# Altium schematic symbol library jlcpcb_2025_04_inductors_extended_0402.schlib: 1396 symbols (part 6 of 8)
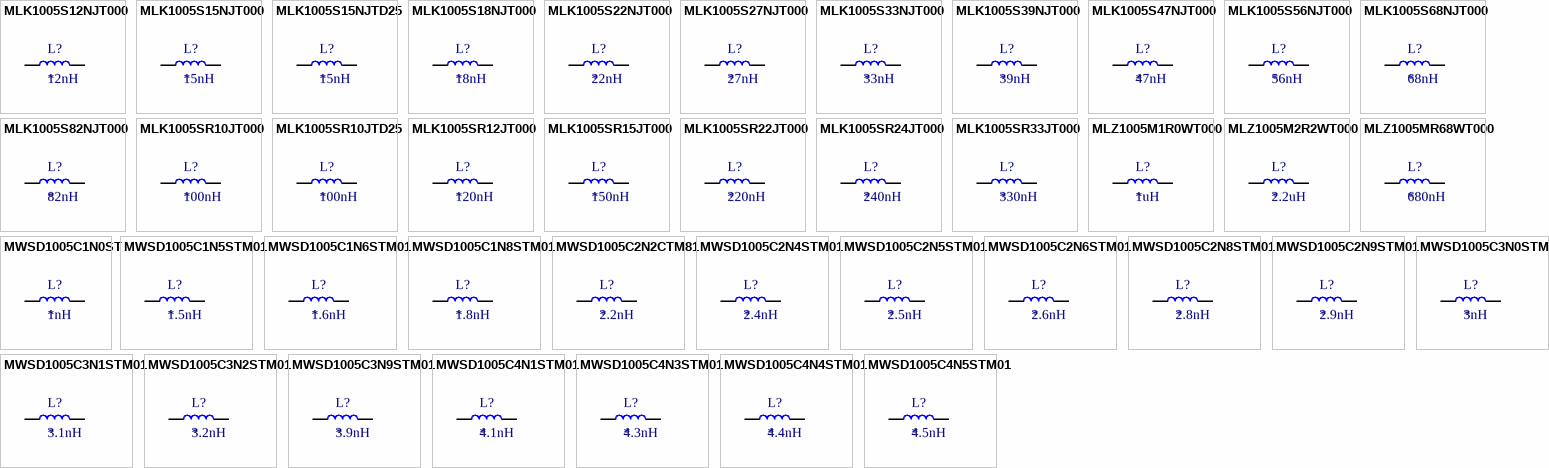
[diagram p39: symbols MLK1005S12NJT000 to MWSD1005C4N5STM01]

## MWSD1005C2N2CTM81
designator L?  Inductance: 2.2nH
Inductor, 2.2nH, 22mΩ, 2.53A, SMD 0402; Manufacturer: Sunlord; Manufacturer Part Number: MWSD1005C2N2CTM81; Package Size: 0402; JLCPCB Basic Part: No; JLCPCB Part Number: C882632; Supplier 1: LCSC; Category: Inductors; Supplier Part Number 1: C882632; Rated Current: 2.53A; DC Resistance: 22mΩ; RoHS: Yes; ComponentLink1Description: Datasheet; ComponentLink1URL: https://wmsc.lcsc.com/wmsc/upload/file/pdf/v2/lcsc/2310241542_Sunlord-MWSD1005C2N2CTM81_C882632.pdf; ComponentLink2Description: JLCPCB Part URL; ComponentLink2URL: https://jlcpcb.com/partdetail/C882632; ComponentLink3Description: LCSC Part URL; ComponentLink3URL: https://lcsc.com/product-detail/Power-Inductors_Sunlord-Sunlord-MWSD1005C2N2CTM81_C882632.html
footprint IND-0402 (0402 (1005M) Inductor)
pins: 1, 2

## MWSD1005C2N4STM01
designator L?  Inductance: 2.4nH
Inductor, 2.4nH, 50mΩ, 850mA, SMD 0402; Manufacturer: Sunlord; Manufacturer Part Number: MWSD1005C2N4STM01; Package Size: 0402; JLCPCB Basic Part: No; JLCPCB Part Number: C778763; Supplier 1: LCSC; Category: Inductors; Supplier Part Number 1: C778763; Rated Current: 850mA; DC Resistance: 50mΩ; RoHS: Yes; ComponentLink1Description: Datasheet; ComponentLink1URL: https://wmsc.lcsc.com/wmsc/upload/file/pdf/v2/lcsc/2110081730_Sunlord-MWSD1005C2N4STM01_C778763.pdf; ComponentLink2Description: JLCPCB Part URL; ComponentLink2URL: https://jlcpcb.com/partdetail/C778763; ComponentLink3Description: LCSC Part URL; ComponentLink3URL: https://lcsc.com/product-detail/Inductors-SMD_Sunlord-Sunlord-MWSD1005C2N4STM01_C778763.html
footprint IND-0402 (0402 (1005M) Inductor)
pins: 1, 2

## MWSD1005C2N5STM01
designator L?  Inductance: 2.5nH
Inductor, 2.5nH, 50mΩ, 850mA, SMD 0402; Manufacturer: Sunlord; Manufacturer Part Number: MWSD1005C2N5STM01; Package Size: 0402; JLCPCB Basic Part: No; JLCPCB Part Number: C778764; Supplier 1: LCSC; Category: Inductors; Supplier Part Number 1: C778764; Rated Current: 850mA; DC Resistance: 50mΩ; RoHS: Yes; ComponentLink1Description: Datasheet; ComponentLink1URL: https://wmsc.lcsc.com/wmsc/upload/file/pdf/v2/lcsc/2110081730_Sunlord-MWSD1005C2N5STM01_C778764.pdf; ComponentLink2Description: JLCPCB Part URL; ComponentLink2URL: https://jlcpcb.com/partdetail/C778764; ComponentLink3Description: LCSC Part URL; ComponentLink3URL: https://lcsc.com/product-detail/Inductors-SMD_Sunlord-Sunlord-MWSD1005C2N5STM01_C778764.html
footprint IND-0402 (0402 (1005M) Inductor)
pins: 1, 2

## MWSD1005C2N6STM01
designator L?  Inductance: 2.6nH
Inductor, 2.6nH, 50mΩ, 850mA, SMD 0402; Manufacturer: Sunlord; Manufacturer Part Number: MWSD1005C2N6STM01; Package Size: 0402; JLCPCB Basic Part: No; JLCPCB Part Number: C778765; Supplier 1: LCSC; Category: Inductors; Supplier Part Number 1: C778765; Rated Current: 850mA; DC Resistance: 50mΩ; RoHS: Yes; ComponentLink1Description: Datasheet; ComponentLink1URL: https://wmsc.lcsc.com/wmsc/upload/file/pdf/v2/lcsc/2110081730_Sunlord-MWSD1005C2N6STM01_C778765.pdf; ComponentLink2Description: JLCPCB Part URL; ComponentLink2URL: https://jlcpcb.com/partdetail/C778765; ComponentLink3Description: LCSC Part URL; ComponentLink3URL: https://lcsc.com/product-detail/Inductors-SMD_Sunlord-Sunlord-MWSD1005C2N6STM01_C778765.html
footprint IND-0402 (0402 (1005M) Inductor)
pins: 1, 2

## MWSD1005C2N8STM01
designator L?  Inductance: 2.8nH
Inductor, 2.8nH, 50mΩ, 850mA, SMD 0402; Manufacturer: Sunlord; Manufacturer Part Number: MWSD1005C2N8STM01; Package Size: 0402; JLCPCB Basic Part: No; JLCPCB Part Number: C778767; Supplier 1: LCSC; Category: Inductors; Supplier Part Number 1: C778767; Rated Current: 850mA; DC Resistance: 50mΩ; RoHS: Yes; ComponentLink1Description: Datasheet; ComponentLink1URL: https://wmsc.lcsc.com/wmsc/upload/file/pdf/v2/lcsc/2110081730_Sunlord-MWSD1005C2N8STM01_C778767.pdf; ComponentLink2Description: JLCPCB Part URL; ComponentLink2URL: https://jlcpcb.com/partdetail/C778767; ComponentLink3Description: LCSC Part URL; ComponentLink3URL: https://lcsc.com/product-detail/Inductors-SMD_Sunlord-Sunlord-MWSD1005C2N8STM01_C778767.html
footprint IND-0402 (0402 (1005M) Inductor)
pins: 1, 2

## MWSD1005C2N9STM01
designator L?  Inductance: 2.9nH
Inductor, 2.9nH, 70mΩ, 750mA, SMD 0402; Manufacturer: Sunlord; Manufacturer Part Number: MWSD1005C2N9STM01; Package Size: 0402; JLCPCB Basic Part: No; JLCPCB Part Number: C778768; Supplier 1: LCSC; Category: Inductors; Supplier Part Number 1: C778768; Rated Current: 750mA; DC Resistance: 70mΩ; RoHS: Yes; ComponentLink1Description: Datasheet; ComponentLink1URL: https://wmsc.lcsc.com/wmsc/upload/file/pdf/v2/lcsc/2110081730_Sunlord-MWSD1005C2N9STM01_C778768.pdf; ComponentLink2Description: JLCPCB Part URL; ComponentLink2URL: https://jlcpcb.com/partdetail/C778768; ComponentLink3Description: LCSC Part URL; ComponentLink3URL: https://lcsc.com/product-detail/Inductors-SMD_Sunlord-Sunlord-MWSD1005C2N9STM01_C778768.html
footprint IND-0402 (0402 (1005M) Inductor)
pins: 1, 2

## MWSD1005C3N0STM01
designator L?  Inductance: 3nH
Inductor, 3nH, 70mΩ, 750mA, SMD 0402; Manufacturer: Sunlord; Manufacturer Part Number: MWSD1005C3N0STM01; Package Size: 0402; JLCPCB Basic Part: No; JLCPCB Part Number: C778769; Supplier 1: LCSC; Category: Inductors; Supplier Part Number 1: C778769; Rated Current: 750mA; DC Resistance: 70mΩ; RoHS: Yes; ComponentLink1Description: Datasheet; ComponentLink1URL: https://wmsc.lcsc.com/wmsc/upload/file/pdf/v2/lcsc/2110081730_Sunlord-MWSD1005C3N0STM01_C778769.pdf; ComponentLink2Description: JLCPCB Part URL; ComponentLink2URL: https://jlcpcb.com/partdetail/C778769; ComponentLink3Description: LCSC Part URL; ComponentLink3URL: https://lcsc.com/product-detail/Inductors-SMD_Sunlord-Sunlord-MWSD1005C3N0STM01_C778769.html
footprint IND-0402 (0402 (1005M) Inductor)
pins: 1, 2

## MWSD1005C3N1STM01
designator L?  Inductance: 3.1nH
Inductor, 3.1nH, 130mΩ, 570mA, SMD 0402; Manufacturer: Sunlord; Manufacturer Part Number: MWSD1005C3N1STM01; Package Size: 0402; JLCPCB Basic Part: No; JLCPCB Part Number: C778770; Supplier 1: LCSC; Category: Inductors; Supplier Part Number 1: C778770; Rated Current: 570mA; DC Resistance: 130mΩ; RoHS: Yes; ComponentLink1Description: Datasheet; ComponentLink1URL: https://wmsc.lcsc.com/wmsc/upload/file/pdf/v2/lcsc/2110081730_Sunlord-MWSD1005C3N1STM01_C778770.pdf; ComponentLink2Description: JLCPCB Part URL; ComponentLink2URL: https://jlcpcb.com/partdetail/C778770; ComponentLink3Description: LCSC Part URL; ComponentLink3URL: https://lcsc.com/product-detail/Inductors-SMD_Sunlord-Sunlord-MWSD1005C3N1STM01_C778770.html
footprint IND-0402 (0402 (1005M) Inductor)
pins: 1, 2

## MWSD1005C3N2STM01
designator L?  Inductance: 3.2nH
Inductor, 3.2nH, 170mΩ, 500mA, SMD 0402; Manufacturer: Sunlord; Manufacturer Part Number: MWSD1005C3N2STM01; Package Size: 0402; JLCPCB Basic Part: No; JLCPCB Part Number: C778771; Supplier 1: LCSC; Category: Inductors; Supplier Part Number 1: C778771; Rated Current: 500mA; DC Resistance: 170mΩ; RoHS: Yes; ComponentLink1Description: Datasheet; ComponentLink1URL: https://wmsc.lcsc.com/wmsc/upload/file/pdf/v2/lcsc/2110081730_Sunlord-MWSD1005C3N2STM01_C778771.pdf; ComponentLink2Description: JLCPCB Part URL; ComponentLink2URL: https://jlcpcb.com/partdetail/C778771; ComponentLink3Description: LCSC Part URL; ComponentLink3URL: https://lcsc.com/product-detail/Inductors-SMD_Sunlord-Sunlord-MWSD1005C3N2STM01_C778771.html
footprint IND-0402 (0402 (1005M) Inductor)
pins: 1, 2

## MWSD1005C3N9STM01
designator L?  Inductance: 3.9nH
Inductor, 3.9nH, 70mΩ, 750mA, SMD 0402; Manufacturer: Sunlord; Manufacturer Part Number: MWSD1005C3N9STM01; Package Size: 0402; JLCPCB Basic Part: No; JLCPCB Part Number: C778772; Supplier 1: LCSC; Category: Inductors; Supplier Part Number 1: C778772; Rated Current: 750mA; DC Resistance: 70mΩ; RoHS: Yes; ComponentLink1Description: Datasheet; ComponentLink1URL: https://wmsc.lcsc.com/wmsc/upload/file/pdf/v2/lcsc/2110081730_Sunlord-MWSD1005C3N9STM01_C778772.pdf; ComponentLink2Description: JLCPCB Part URL; ComponentLink2URL: https://jlcpcb.com/partdetail/C778772; ComponentLink3Description: LCSC Part URL; ComponentLink3URL: https://lcsc.com/product-detail/Inductors-SMD_Sunlord-Sunlord-MWSD1005C3N9STM01_C778772.html
footprint IND-0402 (0402 (1005M) Inductor)
pins: 1, 2

## MWSD1005C4N1STM01
designator L?  Inductance: 4.1nH
Inductor, 4.1nH, 70mΩ, 750mA, SMD 0402; Manufacturer: Sunlord; Manufacturer Part Number: MWSD1005C4N1STM01; Package Size: 0402; JLCPCB Basic Part: No; JLCPCB Part Number: C778773; Supplier 1: LCSC; Category: Inductors; Supplier Part Number 1: C778773; Rated Current: 750mA; DC Resistance: 70mΩ; RoHS: Yes; ComponentLink1Description: Datasheet; ComponentLink1URL: https://wmsc.lcsc.com/wmsc/upload/file/pdf/v2/lcsc/2110081730_Sunlord-MWSD1005C4N1STM01_C778773.pdf; ComponentLink2Description: JLCPCB Part URL; ComponentLink2URL: https://jlcpcb.com/partdetail/C778773; ComponentLink3Description: LCSC Part URL; ComponentLink3URL: https://lcsc.com/product-detail/Inductors-SMD_Sunlord-Sunlord-MWSD1005C4N1STM01_C778773.html
footprint IND-0402 (0402 (1005M) Inductor)
pins: 1, 2

## MWSD1005C4N3STM01
designator L?  Inductance: 4.3nH
Inductor, 4.3nH, 70mΩ, 750mA, SMD 0402; Manufacturer: Sunlord; Manufacturer Part Number: MWSD1005C4N3STM01; Package Size: 0402; JLCPCB Basic Part: No; JLCPCB Part Number: C778774; Supplier 1: LCSC; Category: Inductors; Supplier Part Number 1: C778774; Rated Current: 750mA; DC Resistance: 70mΩ; RoHS: Yes; ComponentLink1Description: Datasheet; ComponentLink1URL: https://wmsc.lcsc.com/wmsc/upload/file/pdf/v2/lcsc/2110081730_Sunlord-MWSD1005C4N3STM01_C778774.pdf; ComponentLink2Description: JLCPCB Part URL; ComponentLink2URL: https://jlcpcb.com/partdetail/C778774; ComponentLink3Description: LCSC Part URL; ComponentLink3URL: https://lcsc.com/product-detail/Inductors-SMD_Sunlord-Sunlord-MWSD1005C4N3STM01_C778774.html
footprint IND-0402 (0402 (1005M) Inductor)
pins: 1, 2

## MWSD1005C4N4STM01
designator L?  Inductance: 4.4nH
Inductor, 4.4nH, 70mΩ, 750mA, SMD 0402; Manufacturer: Sunlord; Manufacturer Part Number: MWSD1005C4N4STM01; Package Size: 0402; JLCPCB Basic Part: No; JLCPCB Part Number: C778775; Supplier 1: LCSC; Category: Inductors; Supplier Part Number 1: C778775; Rated Current: 750mA; DC Resistance: 70mΩ; RoHS: Yes; ComponentLink1Description: Datasheet; ComponentLink1URL: https://wmsc.lcsc.com/wmsc/upload/file/pdf/v2/lcsc/2110081730_Sunlord-MWSD1005C4N4STM01_C778775.pdf; ComponentLink2Description: JLCPCB Part URL; ComponentLink2URL: https://jlcpcb.com/partdetail/C778775; ComponentLink3Description: LCSC Part URL; ComponentLink3URL: https://lcsc.com/product-detail/Inductors-SMD_Sunlord-Sunlord-MWSD1005C4N4STM01_C778775.html
footprint IND-0402 (0402 (1005M) Inductor)
pins: 1, 2

## MWSD1005C4N5STM01
designator L?  Inductance: 4.5nH
Inductor, 4.5nH, 70mΩ, 750mA, SMD 0402; Manufacturer: Sunlord; Manufacturer Part Number: MWSD1005C4N5STM01; Package Size: 0402; JLCPCB Basic Part: No; JLCPCB Part Number: C778776; Supplier 1: LCSC; Category: Inductors; Supplier Part Number 1: C778776; Rated Current: 750mA; DC Resistance: 70mΩ; RoHS: Yes; ComponentLink1Description: Datasheet; ComponentLink1URL: https://wmsc.lcsc.com/wmsc/upload/file/pdf/v2/lcsc/2110081730_Sunlord-MWSD1005C4N5STM01_C778776.pdf; ComponentLink2Description: JLCPCB Part URL; ComponentLink2URL: https://jlcpcb.com/partdetail/C778776; ComponentLink3Description: LCSC Part URL; ComponentLink3URL: https://lcsc.com/product-detail/Inductors-SMD_Sunlord-Sunlord-MWSD1005C4N5STM01_C778776.html
footprint IND-0402 (0402 (1005M) Inductor)
pins: 1, 2

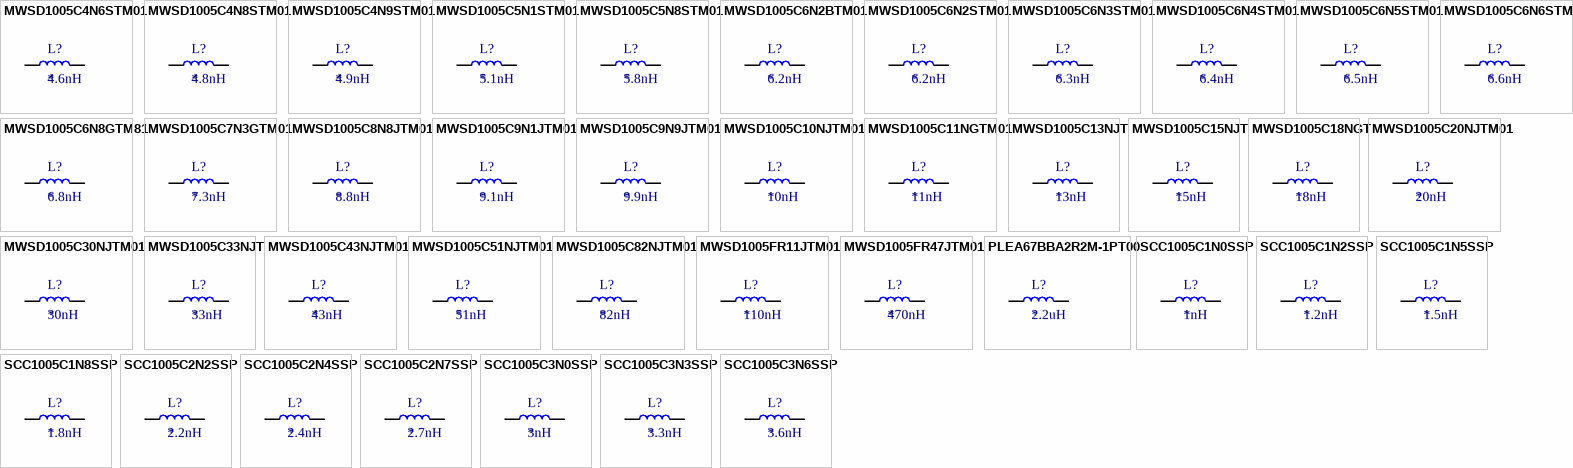
[diagram p24: symbols MWSD1005C4N6STM01 to SCC1005C3N6SSP]

## MWSD1005C4N6STM01
designator L?  Inductance: 4.6nH
Inductor, 4.6nH, 70mΩ, 750mA, SMD 0402; Manufacturer: Sunlord; Manufacturer Part Number: MWSD1005C4N6STM01; Self-Resonant Frequency: 6GHz; Q Factor: 25@250MHz; Package Size: 0402; JLCPCB Basic Part: No; JLCPCB Part Number: C778777; Supplier 1: LCSC; Category: Inductors; Supplier Part Number 1: C778777; Rated Current: 750mA; DC Resistance: 70mΩ; RoHS: Yes; ComponentLink1Description: Datasheet; ComponentLink1URL: https://wmsc.lcsc.com/wmsc/upload/file/pdf/v2/lcsc/2110081730_Sunlord-MWSD1005C4N6STM01_C778777.pdf; ComponentLink2Description: JLCPCB Part URL; ComponentLink2URL: https://jlcpcb.com/partdetail/C778777; ComponentLink3Description: LCSC Part URL; ComponentLink3URL: https://lcsc.com/product-detail/Inductors-SMD_Sunlord-Sunlord-MWSD1005C4N6STM01_C778777.html
footprint IND-0402 (0402 (1005M) Inductor)
pins: 1, 2

## MWSD1005C4N8STM01
designator L?  Inductance: 4.8nH
Inductor, 4.8nH, 70mΩ, 750mA, SMD 0402; Manufacturer: Sunlord; Manufacturer Part Number: MWSD1005C4N8STM01; Package Size: 0402; JLCPCB Basic Part: No; JLCPCB Part Number: C778779; Supplier 1: LCSC; Category: Inductors; Supplier Part Number 1: C778779; Rated Current: 750mA; DC Resistance: 70mΩ; RoHS: Yes; ComponentLink1Description: Datasheet; ComponentLink1URL: https://wmsc.lcsc.com/wmsc/upload/file/pdf/v2/lcsc/2110081730_Sunlord-MWSD1005C4N8STM01_C778779.pdf; ComponentLink2Description: JLCPCB Part URL; ComponentLink2URL: https://jlcpcb.com/partdetail/C778779; ComponentLink3Description: LCSC Part URL; ComponentLink3URL: https://lcsc.com/product-detail/Inductors-SMD_Sunlord-Sunlord-MWSD1005C4N8STM01_C778779.html
footprint IND-0402 (0402 (1005M) Inductor)
pins: 1, 2

## MWSD1005C4N9STM01
designator L?  Inductance: 4.9nH
Inductor, 4.9nH, 120mΩ, 600mA, SMD 0402; Manufacturer: Sunlord; Manufacturer Part Number: MWSD1005C4N9STM01; Package Size: 0402; JLCPCB Basic Part: No; JLCPCB Part Number: C778780; Supplier 1: LCSC; Category: Inductors; Supplier Part Number 1: C778780; Rated Current: 600mA; DC Resistance: 120mΩ; RoHS: Yes; ComponentLink1Description: Datasheet; ComponentLink1URL: https://wmsc.lcsc.com/wmsc/upload/file/pdf/v2/lcsc/2110081730_Sunlord-MWSD1005C4N9STM01_C778780.pdf; ComponentLink2Description: JLCPCB Part URL; ComponentLink2URL: https://jlcpcb.com/partdetail/C778780; ComponentLink3Description: LCSC Part URL; ComponentLink3URL: https://lcsc.com/product-detail/Inductors-SMD_Sunlord-Sunlord-MWSD1005C4N9STM01_C778780.html
footprint IND-0402 (0402 (1005M) Inductor)
pins: 1, 2

## MWSD1005C5N1STM01
designator L?  Inductance: 5.1nH
Inductor, 5.1nH, 120mΩ, 600mA, SMD 0402; Manufacturer: Sunlord; Manufacturer Part Number: MWSD1005C5N1STM01; Package Size: 0402; JLCPCB Basic Part: No; JLCPCB Part Number: C778782; Supplier 1: LCSC; Category: Inductors; Supplier Part Number 1: C778782; Rated Current: 600mA; DC Resistance: 120mΩ; RoHS: Yes; ComponentLink1Description: Datasheet; ComponentLink1URL: https://wmsc.lcsc.com/wmsc/upload/file/pdf/v2/lcsc/2110081730_Sunlord-MWSD1005C5N1STM01_C778782.pdf; ComponentLink2Description: JLCPCB Part URL; ComponentLink2URL: https://jlcpcb.com/partdetail/C778782; ComponentLink3Description: LCSC Part URL; ComponentLink3URL: https://lcsc.com/product-detail/Inductors-SMD_Sunlord-Sunlord-MWSD1005C5N1STM01_C778782.html
footprint IND-0402 (0402 (1005M) Inductor)
pins: 1, 2

## MWSD1005C5N8STM01
designator L?  Inductance: 5.8nH
Inductor, 5.8nH, 120mΩ, 700mA, SMD 0402; Manufacturer: Sunlord; Manufacturer Part Number: MWSD1005C5N8STM01; Self-Resonant Frequency: 6GHz; Q Factor: 25@250MHz; Package Size: 0402; JLCPCB Basic Part: No; JLCPCB Part Number: C778783; Supplier 1: LCSC; Category: Inductors; Supplier Part Number 1: C778783; Rated Current: 700mA; DC Resistance: 120mΩ; RoHS: Yes; ComponentLink1Description: Datasheet; ComponentLink1URL: https://wmsc.lcsc.com/wmsc/upload/file/pdf/v2/lcsc/2110081730_Sunlord-MWSD1005C5N8STM01_C778783.pdf; ComponentLink2Description: JLCPCB Part URL; ComponentLink2URL: https://jlcpcb.com/partdetail/C778783; ComponentLink3Description: LCSC Part URL; ComponentLink3URL: https://lcsc.com/product-detail/Inductors-SMD_Sunlord-Sunlord-MWSD1005C5N8STM01_C778783.html
footprint IND-0402 (0402 (1005M) Inductor)
pins: 1, 2

## MWSD1005C6N2BTM01
designator L?  Inductance: 6.2nH
Inductor, 6.2nH, 90mΩ, 700mA, SMD 0402; Manufacturer: Sunlord; Manufacturer Part Number: MWSD1005C6N2BTM01; Self-Resonant Frequency: 100MHz; Q Factor: 25@250MHz; Package Size: 0402; JLCPCB Basic Part: No; JLCPCB Part Number: C370050; Supplier 1: LCSC; Category: Inductors; Supplier Part Number 1: C370050; Rated Current: 700mA; DC Resistance: 90mΩ; RoHS: Yes; ComponentLink1Description: Datasheet; ComponentLink1URL: https://wmsc.lcsc.com/wmsc/upload/file/pdf/v2/lcsc/2310251550_Sunlord-MWSD1005C6N2BTM01_C370050.pdf; ComponentLink2Description: JLCPCB Part URL; ComponentLink2URL: https://jlcpcb.com/partdetail/C370050; ComponentLink3Description: LCSC Part URL; ComponentLink3URL: https://lcsc.com/product-detail/Inductors-SMD_Sunlord-Sunlord-MWSD1005C6N2BTM01_C370050.html
footprint IND-0402 (0402 (1005M) Inductor)
pins: 1, 2

## MWSD1005C6N2STM01
designator L?  Inductance: 6.2nH
Inductor, 6.2nH, 90mΩ, 700mA, SMD 0402; Manufacturer: Sunlord; Manufacturer Part Number: MWSD1005C6N2STM01; Package Size: 0402; JLCPCB Basic Part: No; JLCPCB Part Number: C778784; Supplier 1: LCSC; Category: Inductors; Supplier Part Number 1: C778784; Rated Current: 700mA; DC Resistance: 90mΩ; RoHS: Yes; ComponentLink1Description: Datasheet; ComponentLink1URL: https://wmsc.lcsc.com/wmsc/upload/file/pdf/v2/lcsc/2110081730_Sunlord-MWSD1005C6N2STM01_C778784.pdf; ComponentLink2Description: JLCPCB Part URL; ComponentLink2URL: https://jlcpcb.com/partdetail/C778784; ComponentLink3Description: LCSC Part URL; ComponentLink3URL: https://lcsc.com/product-detail/Inductors-SMD_Sunlord-Sunlord-MWSD1005C6N2STM01_C778784.html
footprint IND-0402 (0402 (1005M) Inductor)
pins: 1, 2

## MWSD1005C6N3STM01
designator L?  Inductance: 6.3nH
Inductor, 6.3nH, 90mΩ, 700mA, SMD 0402; Manufacturer: Sunlord; Manufacturer Part Number: MWSD1005C6N3STM01; Package Size: 0402; JLCPCB Basic Part: No; JLCPCB Part Number: C778785; Supplier 1: LCSC; Category: Inductors; Supplier Part Number 1: C778785; Rated Current: 700mA; DC Resistance: 90mΩ; RoHS: Yes; ComponentLink1Description: Datasheet; ComponentLink1URL: https://wmsc.lcsc.com/wmsc/upload/file/pdf/v2/lcsc/2110081730_Sunlord-MWSD1005C6N3STM01_C778785.pdf; ComponentLink2Description: JLCPCB Part URL; ComponentLink2URL: https://jlcpcb.com/partdetail/C778785; ComponentLink3Description: LCSC Part URL; ComponentLink3URL: https://lcsc.com/product-detail/Inductors-SMD_Sunlord-Sunlord-MWSD1005C6N3STM01_C778785.html
footprint IND-0402 (0402 (1005M) Inductor)
pins: 1, 2

## MWSD1005C6N4STM01
designator L?  Inductance: 6.4nH
Inductor, 6.4nH, 90mΩ, 700mA, SMD 0402; Manufacturer: Sunlord; Manufacturer Part Number: MWSD1005C6N4STM01; Self-Resonant Frequency: 6GHz; Q Factor: 25@250MHz; Package Size: 0402; JLCPCB Basic Part: No; JLCPCB Part Number: C778786; Supplier 1: LCSC; Category: Inductors; Supplier Part Number 1: C778786; Rated Current: 700mA; DC Resistance: 90mΩ; RoHS: Yes; ComponentLink1Description: Datasheet; ComponentLink1URL: https://wmsc.lcsc.com/wmsc/upload/file/pdf/v2/lcsc/2110081730_Sunlord-MWSD1005C6N4STM01_C778786.pdf; ComponentLink2Description: JLCPCB Part URL; ComponentLink2URL: https://jlcpcb.com/partdetail/C778786; ComponentLink3Description: LCSC Part URL; ComponentLink3URL: https://lcsc.com/product-detail/Inductors-SMD_Sunlord-Sunlord-MWSD1005C6N4STM01_C778786.html
footprint IND-0402 (0402 (1005M) Inductor)
pins: 1, 2

## MWSD1005C6N5STM01
designator L?  Inductance: 6.5nH
Inductor, 6.5nH, 90mΩ, 700mA, SMD 0402; Manufacturer: Sunlord; Manufacturer Part Number: MWSD1005C6N5STM01; Package Size: 0402; JLCPCB Basic Part: No; JLCPCB Part Number: C778787; Supplier 1: LCSC; Category: Inductors; Supplier Part Number 1: C778787; Rated Current: 700mA; DC Resistance: 90mΩ; RoHS: Yes; ComponentLink1Description: Datasheet; ComponentLink1URL: https://wmsc.lcsc.com/wmsc/upload/file/pdf/v2/lcsc/2110081730_Sunlord-MWSD1005C6N5STM01_C778787.pdf; ComponentLink2Description: JLCPCB Part URL; ComponentLink2URL: https://jlcpcb.com/partdetail/C778787; ComponentLink3Description: LCSC Part URL; ComponentLink3URL: https://lcsc.com/product-detail/Inductors-SMD_Sunlord-Sunlord-MWSD1005C6N5STM01_C778787.html
footprint IND-0402 (0402 (1005M) Inductor)
pins: 1, 2

## MWSD1005C6N6STM01
designator L?  Inductance: 6.6nH
Inductor, 6.6nH, 90mΩ, 700mA, SMD 0402; Manufacturer: Sunlord; Manufacturer Part Number: MWSD1005C6N6STM01; Package Size: 0402; JLCPCB Basic Part: No; JLCPCB Part Number: C778788; Supplier 1: LCSC; Category: Inductors; Supplier Part Number 1: C778788; Rated Current: 700mA; DC Resistance: 90mΩ; RoHS: Yes; ComponentLink1Description: Datasheet; ComponentLink1URL: https://wmsc.lcsc.com/wmsc/upload/file/pdf/v2/lcsc/2110081730_Sunlord-MWSD1005C6N6STM01_C778788.pdf; ComponentLink2Description: JLCPCB Part URL; ComponentLink2URL: https://jlcpcb.com/partdetail/C778788; ComponentLink3Description: LCSC Part URL; ComponentLink3URL: https://lcsc.com/product-detail/Inductors-SMD_Sunlord-Sunlord-MWSD1005C6N6STM01_C778788.html
footprint IND-0402 (0402 (1005M) Inductor)
pins: 1, 2

## MWSD1005C6N8GTM81
designator L?  Inductance: 6.8nH
Inductor, 6.8nH, ±2%, 68mΩ, 1.45A, SMD 0402; Manufacturer: Sunlord; Manufacturer Part Number: MWSD1005C6N8GTM81; Self-Resonant Frequency: 7GHz; Q Factor: 30@250MHz; Package Size: 0402; JLCPCB Basic Part: No; JLCPCB Part Number: C882647; Supplier 1: LCSC; Category: Inductors; Supplier Part Number 1: C882647; Tolerance: ±2%; Rated Current: 1.45A; DC Resistance: 68mΩ; RoHS: Yes; ComponentLink1Description: Datasheet; ComponentLink1URL: https://wmsc.lcsc.com/wmsc/upload/file/pdf/v2/lcsc/2310241542_Sunlord-MWSD1005C6N8GTM81_C882647.pdf; ComponentLink2Description: JLCPCB Part URL; ComponentLink2URL: https://jlcpcb.com/partdetail/C882647; ComponentLink3Description: LCSC Part URL; ComponentLink3URL: https://lcsc.com/product-detail/Inductors-SMD_Sunlord-Sunlord-MWSD1005C6N8GTM81_C882647.html
footprint IND-0402 (0402 (1005M) Inductor)
pins: 1, 2

## MWSD1005C7N3GTM01
designator L?  Inductance: 7.3nH
Inductor, 7.3nH, ±2%, 130mΩ, 570mA, SMD 0402; Manufacturer: Sunlord; Manufacturer Part Number: MWSD1005C7N3GTM01; Self-Resonant Frequency: 100MHz; Q Factor: 25@250MHz; Package Size: 0402; JLCPCB Basic Part: No; JLCPCB Part Number: C370051; Supplier 1: LCSC; Category: Inductors; Supplier Part Number 1: C370051; Tolerance: ±2%; Rated Current: 570mA; DC Resistance: 130mΩ; RoHS: Yes; ComponentLink1Description: Datasheet; ComponentLink1URL: https://wmsc.lcsc.com/wmsc/upload/file/pdf/v2/lcsc/2310251550_Sunlord-MWSD1005C7N3GTM01_C370051.pdf; ComponentLink2Description: JLCPCB Part URL; ComponentLink2URL: https://jlcpcb.com/partdetail/C370051; ComponentLink3Description: LCSC Part URL; ComponentLink3URL: https://lcsc.com/product-detail/Inductors-SMD_Sunlord-Sunlord-MWSD1005C7N3GTM01_C370051.html
footprint IND-0402 (0402 (1005M) Inductor)
pins: 1, 2

## MWSD1005C8N8JTM01
designator L?  Inductance: 8.8nH
Inductor, 8.8nH, ±5%, 140mΩ, 540mA, SMD 0402; Manufacturer: Sunlord; Manufacturer Part Number: MWSD1005C8N8JTM01; Package Size: 0402; JLCPCB Basic Part: No; JLCPCB Part Number: C778799; Supplier 1: LCSC; Category: Inductors; Supplier Part Number 1: C778799; Tolerance: ±5%; Rated Current: 540mA; DC Resistance: 140mΩ; RoHS: Yes; ComponentLink1Description: Datasheet; ComponentLink1URL: https://wmsc.lcsc.com/wmsc/upload/file/pdf/v2/lcsc/2310251550_Sunlord-MWSD1005C8N8JTM01_C778799.pdf; ComponentLink2Description: JLCPCB Part URL; ComponentLink2URL: https://jlcpcb.com/partdetail/C778799; ComponentLink3Description: LCSC Part URL; ComponentLink3URL: https://lcsc.com/product-detail/Power-Inductors_Sunlord-Sunlord-MWSD1005C8N8JTM01_C778799.html
footprint IND-0402 (0402 (1005M) Inductor)
pins: 1, 2

## MWSD1005C9N1JTM01
designator L?  Inductance: 9.1nH
Inductor, 9.1nH, ±5%, 140mΩ, 540mA, SMD 0402; Manufacturer: Sunlord; Manufacturer Part Number: MWSD1005C9N1JTM01; Package Size: 0402; JLCPCB Basic Part: No; JLCPCB Part Number: C778802; Supplier 1: LCSC; Category: Inductors; Supplier Part Number 1: C778802; Tolerance: ±5%; Rated Current: 540mA; DC Resistance: 140mΩ; RoHS: Yes; ComponentLink1Description: Datasheet; ComponentLink1URL: https://wmsc.lcsc.com/wmsc/upload/file/pdf/v2/lcsc/2310251550_Sunlord-MWSD1005C9N1JTM01_C778802.pdf; ComponentLink2Description: JLCPCB Part URL; ComponentLink2URL: https://jlcpcb.com/partdetail/C778802; ComponentLink3Description: LCSC Part URL; ComponentLink3URL: https://lcsc.com/product-detail/Power-Inductors_Sunlord-Sunlord-MWSD1005C9N1JTM01_C778802.html
footprint IND-0402 (0402 (1005M) Inductor)
pins: 1, 2

## MWSD1005C9N9JTM01
designator L?  Inductance: 9.9nH
Inductor, 9.9nH, ±5%, 140mΩ, 540mA, SMD 0402; Manufacturer: Sunlord; Manufacturer Part Number: MWSD1005C9N9JTM01; Package Size: 0402; JLCPCB Basic Part: No; JLCPCB Part Number: C778810; Supplier 1: LCSC; Category: Inductors; Supplier Part Number 1: C778810; Tolerance: ±5%; Rated Current: 540mA; DC Resistance: 140mΩ; RoHS: Yes; ComponentLink1Description: Datasheet; ComponentLink1URL: https://wmsc.lcsc.com/wmsc/upload/file/pdf/v2/lcsc/2310251550_Sunlord-MWSD1005C9N9JTM01_C778810.pdf; ComponentLink2Description: JLCPCB Part URL; ComponentLink2URL: https://jlcpcb.com/partdetail/C778810; ComponentLink3Description: LCSC Part URL; ComponentLink3URL: https://lcsc.com/product-detail/Power-Inductors_Sunlord-Sunlord-MWSD1005C9N9JTM01_C778810.html
footprint IND-0402 (0402 (1005M) Inductor)
pins: 1, 2

## MWSD1005C10NJTM01
designator L?  Inductance: 10nH
Inductor, 10nH, ±5%, 170mΩ, 500mA, SMD 0402; Manufacturer: Sunlord; Manufacturer Part Number: MWSD1005C10NJTM01; Package Size: 0402; JLCPCB Basic Part: No; JLCPCB Part Number: C2991783; Supplier 1: LCSC; Category: Inductors; Supplier Part Number 1: C2991783; Tolerance: ±5%; Rated Current: 500mA; DC Resistance: 170mΩ; RoHS: Yes; ComponentLink1Description: Datasheet; ComponentLink1URL: https://wmsc.lcsc.com/wmsc/upload/file/pdf/v2/lcsc/2310241532_Sunlord-MWSD1005C10NJTM01_C2991783.pdf; ComponentLink2Description: JLCPCB Part URL; ComponentLink2URL: https://jlcpcb.com/partdetail/C2991783; ComponentLink3Description: LCSC Part URL; ComponentLink3URL: https://lcsc.com/product-detail/Power-Inductors_Sunlord-Sunlord-MWSD1005C10NJTM01_C2991783.html
footprint IND-0402 (0402 (1005M) Inductor)
pins: 1, 2

## MWSD1005C11NGTM01
designator L?  Inductance: 11nH
Inductor, 11nH, ±2%, 140mΩ, 500mA, SMD 0402; Manufacturer: Sunlord; Manufacturer Part Number: MWSD1005C11NGTM01; Self-Resonant Frequency: 100MHz; Q Factor: 30@250MHz; Package Size: 0402; JLCPCB Basic Part: No; JLCPCB Part Number: C370044; Supplier 1: LCSC; Category: Inductors; Supplier Part Number 1: C370044; Tolerance: ±2%; Rated Current: 500mA; DC Resistance: 140mΩ; RoHS: Yes; ComponentLink1Description: Datasheet; ComponentLink1URL: https://wmsc.lcsc.com/wmsc/upload/file/pdf/v2/lcsc/2310251550_Sunlord-MWSD1005C11NGTM01_C370044.pdf; ComponentLink2Description: JLCPCB Part URL; ComponentLink2URL: https://jlcpcb.com/partdetail/C370044; ComponentLink3Description: LCSC Part URL; ComponentLink3URL: https://lcsc.com/product-detail/Inductors-SMD_Sunlord-Sunlord-MWSD1005C11NGTM01_C370044.html
footprint IND-0402 (0402 (1005M) Inductor)
pins: 1, 2

## MWSD1005C13NJT
designator L?  Inductance: 13nH
Inductor, 13nH, ±5%, 180mΩ, 460mA, SMD 0402; Manufacturer: Sunlord; Manufacturer Part Number: MWSD1005C13NJT; Package Size: 0402; JLCPCB Basic Part: No; JLCPCB Part Number: C778754; Supplier 1: LCSC; Category: Inductors; Supplier Part Number 1: C778754; Tolerance: ±5%; Rated Current: 460mA; DC Resistance: 180mΩ; RoHS: Yes; ComponentLink1Description: Datasheet; ComponentLink1URL: https://wmsc.lcsc.com/wmsc/upload/file/pdf/v2/lcsc/2310241536_Sunlord-MWSD1005C13NJT_C778754.pdf; ComponentLink2Description: JLCPCB Part URL; ComponentLink2URL: https://jlcpcb.com/partdetail/C778754; ComponentLink3Description: LCSC Part URL; ComponentLink3URL: https://lcsc.com/product-detail/Power-Inductors_Sunlord-Sunlord-MWSD1005C13NJT_C778754.html
footprint IND-0402 (0402 (1005M) Inductor)
pins: 1, 2

## MWSD1005C15NJT
designator L?  Inductance: 15nH
Inductor, 15nH, ±5%, 210mΩ, 430mA, SMD 0402; Manufacturer: Sunlord; Manufacturer Part Number: MWSD1005C15NJT; Self-Resonant Frequency: 5GHz; Q Factor: 26@250MHz; Package Size: 0402; JLCPCB Basic Part: No; JLCPCB Part Number: C778752; Supplier 1: LCSC; Category: Inductors; Supplier Part Number 1: C778752; Tolerance: ±5%; Rated Current: 430mA; DC Resistance: 210mΩ; RoHS: Yes; ComponentLink1Description: Datasheet; ComponentLink1URL: https://wmsc.lcsc.com/wmsc/upload/file/pdf/v2/lcsc/2310251550_Sunlord-MWSD1005C15NJT_C778752.pdf; ComponentLink2Description: JLCPCB Part URL; ComponentLink2URL: https://jlcpcb.com/partdetail/C778752; ComponentLink3Description: LCSC Part URL; ComponentLink3URL: https://lcsc.com/product-detail/Inductors-SMD_Sunlord-Sunlord-MWSD1005C15NJT_C778752.html
footprint IND-0402 (0402 (1005M) Inductor)
pins: 1, 2

## MWSD1005C18NGT
designator L?  Inductance: 18nH
Inductor, 18nH, ±2%, 280mΩ, 370mA, SMD 0402; Manufacturer: Sunlord; Manufacturer Part Number: MWSD1005C18NGT; Package Size: 0402; JLCPCB Basic Part: No; JLCPCB Part Number: C2991785; Supplier 1: LCSC; Category: Inductors; Supplier Part Number 1: C2991785; Tolerance: ±2%; Rated Current: 370mA; DC Resistance: 280mΩ; RoHS: Yes; ComponentLink1Description: Datasheet; ComponentLink1URL: https://wmsc.lcsc.com/wmsc/upload/file/pdf/v2/lcsc/2310251550_Sunlord-MWSD1005C18NGT_C2991785.pdf; ComponentLink2Description: JLCPCB Part URL; ComponentLink2URL: https://jlcpcb.com/partdetail/C2991785; ComponentLink3Description: LCSC Part URL; ComponentLink3URL: https://lcsc.com/product-detail/Power-Inductors_Sunlord-Sunlord-MWSD1005C18NGT_C2991785.html
footprint IND-0402 (0402 (1005M) Inductor)
pins: 1, 2

## MWSD1005C20NJTM01
designator L?  Inductance: 20nH
Inductor, 20nH, ±5%, 270mΩ, 370mA, SMD 0402; Manufacturer: Sunlord; Manufacturer Part Number: MWSD1005C20NJTM01; Self-Resonant Frequency: 4GHz; Q Factor: 25@250MHz; Package Size: 0402; JLCPCB Basic Part: No; JLCPCB Part Number: C778817; Supplier 1: LCSC; Category: Inductors; Supplier Part Number 1: C778817; Tolerance: ±5%; Rated Current: 370mA; DC Resistance: 270mΩ; RoHS: Yes; ComponentLink1Description: Datasheet; ComponentLink1URL: https://wmsc.lcsc.com/wmsc/upload/file/pdf/v2/lcsc/2310251550_Sunlord-MWSD1005C20NJTM01_C778817.pdf; ComponentLink2Description: JLCPCB Part URL; ComponentLink2URL: https://jlcpcb.com/partdetail/C778817; ComponentLink3Description: LCSC Part URL; ComponentLink3URL: https://lcsc.com/product-detail/Inductors-SMD_Sunlord-Sunlord-MWSD1005C20NJTM01_C778817.html
footprint IND-0402 (0402 (1005M) Inductor)
pins: 1, 2

## MWSD1005C30NJTM01
designator L?  Inductance: 30nH
Inductor, 30nH, ±5%, 580mΩ, 270mA, SMD 0402; Manufacturer: Sunlord; Manufacturer Part Number: MWSD1005C30NJTM01; Package Size: 0402; JLCPCB Basic Part: No; JLCPCB Part Number: C778822; Supplier 1: LCSC; Category: Inductors; Supplier Part Number 1: C778822; Tolerance: ±5%; Rated Current: 270mA; DC Resistance: 580mΩ; RoHS: Yes; ComponentLink1Description: Datasheet; ComponentLink1URL: https://wmsc.lcsc.com/wmsc/upload/file/pdf/v2/lcsc/2310251550_Sunlord-MWSD1005C30NJTM01_C778822.pdf; ComponentLink2Description: JLCPCB Part URL; ComponentLink2URL: https://jlcpcb.com/partdetail/C778822; ComponentLink3Description: LCSC Part URL; ComponentLink3URL: https://lcsc.com/product-detail/Power-Inductors_Sunlord-Sunlord-MWSD1005C30NJTM01_C778822.html
footprint IND-0402 (0402 (1005M) Inductor)
pins: 1, 2

## MWSD1005C33NJT
designator L?  Inductance: 33nH
Inductor, 33nH, ±5%, 550mΩ, 260mA, SMD 0402; Manufacturer: Sunlord; Manufacturer Part Number: MWSD1005C33NJT; Self-Resonant Frequency: 250MHz; Q Factor: 24@250MHz; Package Size: 0402; JLCPCB Basic Part: No; JLCPCB Part Number: C370047; Supplier 1: LCSC; Category: Inductors; Supplier Part Number 1: C370047; Tolerance: ±5%; Rated Current: 260mA; DC Resistance: 550mΩ; RoHS: Yes; ComponentLink1Description: Datasheet; ComponentLink1URL: https://wmsc.lcsc.com/wmsc/upload/file/pdf/v2/lcsc/2310251550_Sunlord-MWSD1005C33NJT_C370047.pdf; ComponentLink2Description: JLCPCB Part URL; ComponentLink2URL: https://jlcpcb.com/partdetail/C370047; ComponentLink3Description: LCSC Part URL; ComponentLink3URL: https://lcsc.com/product-detail/Inductors-SMD_Sunlord-Sunlord-MWSD1005C33NJT_C370047.html
footprint IND-0402 (0402 (1005M) Inductor)
pins: 1, 2

## MWSD1005C43NJTM01
designator L?  Inductance: 43nH
Inductor, 43nH, ±5%, 700mΩ, 250mA, SMD 0402; Manufacturer: Sunlord; Manufacturer Part Number: MWSD1005C43NJTM01; Package Size: 0402; JLCPCB Basic Part: No; JLCPCB Part Number: C778827; Supplier 1: LCSC; Category: Inductors; Supplier Part Number 1: C778827; Tolerance: ±5%; Rated Current: 250mA; DC Resistance: 700mΩ; RoHS: Yes; ComponentLink1Description: Datasheet; ComponentLink1URL: https://wmsc.lcsc.com/wmsc/upload/file/pdf/v2/lcsc/2310251550_Sunlord-MWSD1005C43NJTM01_C778827.pdf; ComponentLink2Description: JLCPCB Part URL; ComponentLink2URL: https://jlcpcb.com/partdetail/C778827; ComponentLink3Description: LCSC Part URL; ComponentLink3URL: https://lcsc.com/product-detail/Power-Inductors_Sunlord-Sunlord-MWSD1005C43NJTM01_C778827.html
footprint IND-0402 (0402 (1005M) Inductor)
pins: 1, 2

## MWSD1005C51NJTM01
designator L?  Inductance: 51nH
Inductor, 51nH, ±5%, 1.08Ω, 210mA, SMD 0402; Manufacturer: Sunlord; Manufacturer Part Number: MWSD1005C51NJTM01; Package Size: 0402; JLCPCB Basic Part: No; JLCPCB Part Number: C778829; Supplier 1: LCSC; Category: Inductors; Supplier Part Number 1: C778829; Tolerance: ±5%; Rated Current: 210mA; DC Resistance: 1.08Ω; RoHS: Yes; ComponentLink1Description: Datasheet; ComponentLink1URL: https://wmsc.lcsc.com/wmsc/upload/file/pdf/v2/lcsc/2310241612_Sunlord-MWSD1005C51NJTM01_C778829.pdf; ComponentLink2Description: JLCPCB Part URL; ComponentLink2URL: https://jlcpcb.com/partdetail/C778829; ComponentLink3Description: LCSC Part URL; ComponentLink3URL: https://lcsc.com/product-detail/Power-Inductors_Sunlord-Sunlord-MWSD1005C51NJTM01_C778829.html
footprint IND-0402 (0402 (1005M) Inductor)
pins: 1, 2

## MWSD1005C82NJTM01
designator L?  Inductance: 82nH
Inductor, 82nH, ±5%, 2.24Ω, 130mA, SMD 0402; Manufacturer: Sunlord; Manufacturer Part Number: MWSD1005C82NJTM01; Package Size: 0402; JLCPCB Basic Part: No; JLCPCB Part Number: C778834; Supplier 1: LCSC; Category: Inductors; Supplier Part Number 1: C778834; Tolerance: ±5%; Rated Current: 130mA; DC Resistance: 2.24Ω; RoHS: Yes; ComponentLink1Description: Datasheet; ComponentLink1URL: https://wmsc.lcsc.com/wmsc/upload/file/pdf/v2/lcsc/2310251550_Sunlord-MWSD1005C82NJTM01_C778834.pdf; ComponentLink2Description: JLCPCB Part URL; ComponentLink2URL: https://jlcpcb.com/partdetail/C778834; ComponentLink3Description: LCSC Part URL; ComponentLink3URL: https://lcsc.com/product-detail/Power-Inductors_Sunlord-Sunlord-MWSD1005C82NJTM01_C778834.html
footprint IND-0402 (0402 (1005M) Inductor)
pins: 1, 2

## MWSD1005FR11JTM01
designator L?  Inductance: 110nH
Inductor, 110nH, ±5%, 144mΩ, 850mA, SMD 0402; Manufacturer: Sunlord; Manufacturer Part Number: MWSD1005FR11JTM01; Self-Resonant Frequency: 1.5GHz; Package Size: 0402; JLCPCB Basic Part: No; JLCPCB Part Number: C969951; Supplier 1: LCSC; Category: Inductors; Supplier Part Number 1: C969951; Tolerance: ±5%; Rated Current: 850mA; DC Resistance: 144mΩ; RoHS: Yes; ComponentLink1Description: Datasheet; ComponentLink1URL: https://wmsc.lcsc.com/wmsc/upload/file/pdf/v2/lcsc/2310301640_Sunlord-MWSD1005FR11JTM01_C969951.pdf; ComponentLink2Description: JLCPCB Part URL; ComponentLink2URL: https://jlcpcb.com/partdetail/C969951; ComponentLink3Description: LCSC Part URL; ComponentLink3URL: https://lcsc.com/product-detail/Inductors-SMD_Sunlord-Sunlord-MWSD1005FR11JTM01_C969951.html
footprint IND-0402 (0402 (1005M) Inductor)
pins: 1, 2

## MWSD1005FR47JTM01
designator L?  Inductance: 470nH
Inductor, 470nH, ±5%, 660mΩ, 350mA, SMD 0402; Manufacturer: Sunlord; Manufacturer Part Number: MWSD1005FR47JTM01; Self-Resonant Frequency: 380MHz; Package Size: 0402; JLCPCB Basic Part: No; JLCPCB Part Number: C969962; Supplier 1: LCSC; Category: Inductors; Supplier Part Number 1: C969962; Tolerance: ±5%; Rated Current: 350mA; DC Resistance: 660mΩ; RoHS: Yes; ComponentLink1Description: Datasheet; ComponentLink1URL: https://wmsc.lcsc.com/wmsc/upload/file/pdf/v2/lcsc/2310301640_Sunlord-MWSD1005FR47JTM01_C969962.pdf; ComponentLink2Description: JLCPCB Part URL; ComponentLink2URL: https://jlcpcb.com/partdetail/C969962; ComponentLink3Description: LCSC Part URL; ComponentLink3URL: https://lcsc.com/product-detail/Inductors-SMD_Sunlord-Sunlord-MWSD1005FR47JTM01_C969962.html
footprint IND-0402 (0402 (1005M) Inductor)
pins: 1, 2

## PLEA67BBA2R2M-1PT00
designator L?  Inductance: 2.2uH
Inductor, 2.2uH, ±20%, 620mΩ, 800mA, SMD 0402; Manufacturer: TDK; Manufacturer Part Number: PLEA67BBA2R2M-1PT00; Saturation Current: 600mA; Package Size: 0402; JLCPCB Basic Part: No; JLCPCB Part Number: C3911260; Supplier 1: LCSC; Category: Inductors; Supplier Part Number 1: C3911260; Tolerance: ±20%; Rated Current: 800mA; DC Resistance: 620mΩ; RoHS: Yes; ComponentLink1Description: Datasheet; ComponentLink1URL: https://wmsc.lcsc.com/wmsc/upload/file/pdf/v2/lcsc/2401181714_TDK-PLEA67BBA2R2M-1PT00_C3911260.pdf; ComponentLink2Description: JLCPCB Part URL; ComponentLink2URL: https://jlcpcb.com/partdetail/C3911260; ComponentLink3Description: LCSC Part URL; ComponentLink3URL: https://lcsc.com/product-detail/Inductors-SMD_TDK-TDK-PLEA67BBA2R2M-1PT00_C3911260.html
footprint IND-0402 (0402 (1005M) Inductor)
pins: 1, 2

## SCC1005C1N0SSP
designator L?  Inductance: 1nH
Inductor, 1nH, 100mΩ, 400mA, SMD 0402; Manufacturer: Sunltech Tech; Manufacturer Part Number: SCC1005C1N0SSP; Package Size: 0402; JLCPCB Basic Part: No; JLCPCB Part Number: C219518; Supplier 1: LCSC; Category: Inductors; Supplier Part Number 1: C219518; Rated Current: 400mA; DC Resistance: 100mΩ; RoHS: Yes; ComponentLink1Description: Datasheet; ComponentLink1URL: https://wmsc.lcsc.com/wmsc/upload/file/pdf/v2/lcsc/2304140030_Sunltech-Tech-SCC1005C1N0SSP_C219518.pdf; ComponentLink2Description: JLCPCB Part URL; ComponentLink2URL: https://jlcpcb.com/partdetail/C219518; ComponentLink3Description: LCSC Part URL; ComponentLink3URL: https://lcsc.com/product-detail/Inductors-SMD_Sunltech-Tech-Sunltech-Tech-SCC1005C1N0SSP_C219518.html
footprint IND-0402 (0402 (1005M) Inductor)
pins: 1, 2

## SCC1005C1N2SSP
designator L?  Inductance: 1.2nH
Inductor, 1.2nH, 100mΩ, 400mA, SMD 0402; Manufacturer: Sunltech Tech; Manufacturer Part Number: SCC1005C1N2SSP; Package Size: 0402; JLCPCB Basic Part: No; JLCPCB Part Number: C219520; Supplier 1: LCSC; Category: Inductors; Supplier Part Number 1: C219520; Rated Current: 400mA; DC Resistance: 100mΩ; RoHS: Yes; ComponentLink1Description: Datasheet; ComponentLink1URL: https://wmsc.lcsc.com/wmsc/upload/file/pdf/v2/lcsc/2304140030_Sunltech-Tech-SCC1005C1N2SSP_C219520.pdf; ComponentLink2Description: JLCPCB Part URL; ComponentLink2URL: https://jlcpcb.com/partdetail/C219520; ComponentLink3Description: LCSC Part URL; ComponentLink3URL: https://lcsc.com/product-detail/Inductors-SMD_Sunltech-Tech-Sunltech-Tech-SCC1005C1N2SSP_C219520.html
footprint IND-0402 (0402 (1005M) Inductor)
pins: 1, 2

## SCC1005C1N5SSP
designator L?  Inductance: 1.5nH
Inductor, 1.5nH, 130mΩ, 400mA, SMD 0402; Manufacturer: Sunltech Tech; Manufacturer Part Number: SCC1005C1N5SSP; Package Size: 0402; JLCPCB Basic Part: No; JLCPCB Part Number: C219522; Supplier 1: LCSC; Category: Inductors; Supplier Part Number 1: C219522; Rated Current: 400mA; DC Resistance: 130mΩ; RoHS: Yes; ComponentLink1Description: Datasheet; ComponentLink1URL: https://wmsc.lcsc.com/wmsc/upload/file/pdf/v2/lcsc/2304140030_Sunltech-Tech-SCC1005C1N5SSP_C219522.pdf; ComponentLink2Description: JLCPCB Part URL; ComponentLink2URL: https://jlcpcb.com/partdetail/C219522; ComponentLink3Description: LCSC Part URL; ComponentLink3URL: https://lcsc.com/product-detail/Inductors-SMD_Sunltech-Tech-Sunltech-Tech-SCC1005C1N5SSP_C219522.html
footprint IND-0402 (0402 (1005M) Inductor)
pins: 1, 2

## SCC1005C1N8SSP
designator L?  Inductance: 1.8nH
Inductor, 1.8nH, 140mΩ, 400mA, SMD 0402; Manufacturer: Sunltech Tech; Manufacturer Part Number: SCC1005C1N8SSP; Package Size: 0402; JLCPCB Basic Part: No; JLCPCB Part Number: C219523; Supplier 1: LCSC; Category: Inductors; Supplier Part Number 1: C219523; Rated Current: 400mA; DC Resistance: 140mΩ; RoHS: Yes; ComponentLink1Description: Datasheet; ComponentLink1URL: https://wmsc.lcsc.com/wmsc/upload/file/pdf/v2/lcsc/2304140030_Sunltech-Tech-SCC1005C1N8SSP_C219523.pdf; ComponentLink2Description: JLCPCB Part URL; ComponentLink2URL: https://jlcpcb.com/partdetail/C219523; ComponentLink3Description: LCSC Part URL; ComponentLink3URL: https://lcsc.com/product-detail/Inductors-SMD_Sunltech-Tech-Sunltech-Tech-SCC1005C1N8SSP_C219523.html
footprint IND-0402 (0402 (1005M) Inductor)
pins: 1, 2

## SCC1005C2N2SSP
designator L?  Inductance: 2.2nH
Inductor, 2.2nH, 160mΩ, 400mA, SMD 0402; Manufacturer: Sunltech Tech; Manufacturer Part Number: SCC1005C2N2SSP; Package Size: 0402; JLCPCB Basic Part: No; JLCPCB Part Number: C219525; Supplier 1: LCSC; Category: Inductors; Supplier Part Number 1: C219525; Rated Current: 400mA; DC Resistance: 160mΩ; RoHS: Yes; ComponentLink1Description: Datasheet; ComponentLink1URL: https://wmsc.lcsc.com/wmsc/upload/file/pdf/v2/lcsc/2304140030_Sunltech-Tech-SCC1005C2N2SSP_C219525.pdf; ComponentLink2Description: JLCPCB Part URL; ComponentLink2URL: https://jlcpcb.com/partdetail/C219525; ComponentLink3Description: LCSC Part URL; ComponentLink3URL: https://lcsc.com/product-detail/Inductors-SMD_Sunltech-Tech-Sunltech-Tech-SCC1005C2N2SSP_C219525.html
footprint IND-0402 (0402 (1005M) Inductor)
pins: 1, 2

## SCC1005C2N4SSP
designator L?  Inductance: 2.4nH
Inductor, 2.4nH, 160mΩ, 400mA, SMD 0402; Manufacturer: Sunltech Tech; Manufacturer Part Number: SCC1005C2N4SSP; Package Size: 0402; JLCPCB Basic Part: No; JLCPCB Part Number: C219526; Supplier 1: LCSC; Category: Inductors; Supplier Part Number 1: C219526; Rated Current: 400mA; DC Resistance: 160mΩ; RoHS: Yes; ComponentLink1Description: Datasheet; ComponentLink1URL: https://wmsc.lcsc.com/wmsc/upload/file/pdf/v2/lcsc/2304140030_Sunltech-Tech-SCC1005C2N4SSP_C219526.pdf; ComponentLink2Description: JLCPCB Part URL; ComponentLink2URL: https://jlcpcb.com/partdetail/C219526; ComponentLink3Description: LCSC Part URL; ComponentLink3URL: https://lcsc.com/product-detail/Inductors-SMD_Sunltech-Tech-Sunltech-Tech-SCC1005C2N4SSP_C219526.html
footprint IND-0402 (0402 (1005M) Inductor)
pins: 1, 2

## SCC1005C2N7SSP
designator L?  Inductance: 2.7nH
Inductor, 2.7nH, 170mΩ, 400mA, SMD 0402; Manufacturer: Sunltech Tech; Manufacturer Part Number: SCC1005C2N7SSP; Package Size: 0402; JLCPCB Basic Part: No; JLCPCB Part Number: C219527; Supplier 1: LCSC; Category: Inductors; Supplier Part Number 1: C219527; Rated Current: 400mA; DC Resistance: 170mΩ; RoHS: Yes; ComponentLink1Description: Datasheet; ComponentLink1URL: https://wmsc.lcsc.com/wmsc/upload/file/pdf/v2/lcsc/2304140030_Sunltech-Tech-SCC1005C2N7SSP_C219527.pdf; ComponentLink2Description: JLCPCB Part URL; ComponentLink2URL: https://jlcpcb.com/partdetail/C219527; ComponentLink3Description: LCSC Part URL; ComponentLink3URL: https://lcsc.com/product-detail/Inductors-SMD_Sunltech-Tech-Sunltech-Tech-SCC1005C2N7SSP_C219527.html
footprint IND-0402 (0402 (1005M) Inductor)
pins: 1, 2

## SCC1005C3N0SSP
designator L?  Inductance: 3nH
Inductor, 3nH, 180mΩ, 400mA, SMD 0402; Manufacturer: Sunltech Tech; Manufacturer Part Number: SCC1005C3N0SSP; Package Size: 0402; JLCPCB Basic Part: No; JLCPCB Part Number: C219528; Supplier 1: LCSC; Category: Inductors; Supplier Part Number 1: C219528; Rated Current: 400mA; DC Resistance: 180mΩ; RoHS: Yes; ComponentLink1Description: Datasheet; ComponentLink1URL: https://wmsc.lcsc.com/wmsc/upload/file/pdf/v2/lcsc/2304140030_Sunltech-Tech-SCC1005C3N0SSP_C219528.pdf; ComponentLink2Description: JLCPCB Part URL; ComponentLink2URL: https://jlcpcb.com/partdetail/C219528; ComponentLink3Description: LCSC Part URL; ComponentLink3URL: https://lcsc.com/product-detail/Inductors-SMD_Sunltech-Tech-Sunltech-Tech-SCC1005C3N0SSP_C219528.html
footprint IND-0402 (0402 (1005M) Inductor)
pins: 1, 2
